# Altium footprint library ICs And Semiconductors SMD.PcbLib: 943 footprints (part 53 of 60)
Each footprint in its own frame and in the unit in brackets; x right, y up, seen from the top. Pads: shape width x height; smd on the part's side, far side on the other; paste and mask are expansions set on the pad; w line width, h text height; cw(c..) or ccw(c..) is an arc to the next point about the centre after c.
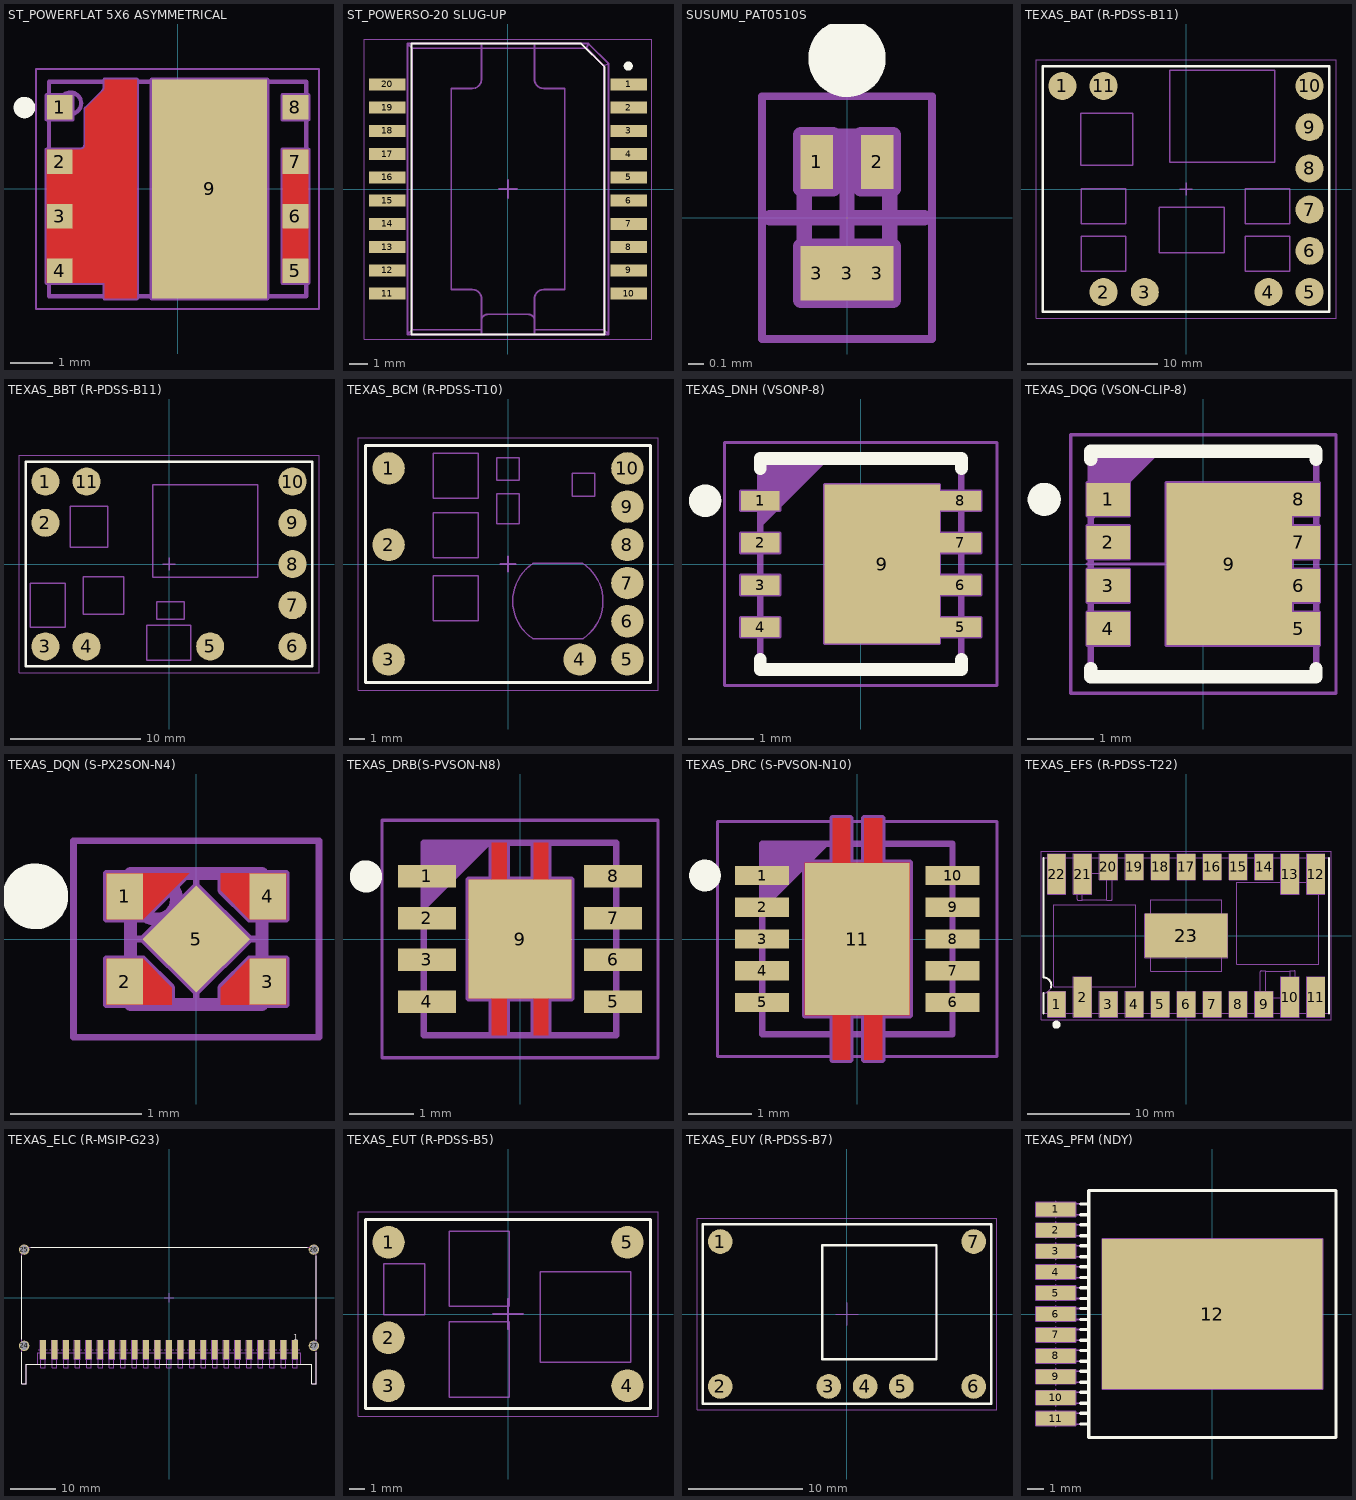
[diagram p52: the footprints below, top view; thin cyan lines are the x and y axes]

## ST_POWERFLAT 5X6 ASYMMETRICAL [mm] "PowerFLAT™ 5x6, 1.27mm Pitch; 9 Pin, Body 5.00mm W X 6.00mm L X 1.00mm H, with Two Thermal Pad (Asymmetrical Double Island)"
height 1
pads (9):
  rect 0.6x0.57 smd: 1(-2.75,1.905) 2(-2.75,0.635) 3(-2.75,-0.635) 4(-2.75,-1.905) 5(2.751,-1.905) 6(2.751,-0.635) 7(2.751,0.635) 8(2.751,1.905)
  rect 2.69x5.1 smd: 9(0.746,0)
Top Layer:
  region: 2.451,-2.19 3.051,-2.19 3.051,0.92 2.451,0.92
  region: -3.05,-2.19 -3.05,0.92 -2.25,0.92 -2.231,0.922 -2.195,0.937 -2.167,0.964 -2.152,1 -2.15,1.02 -2.15,1.87 -1.732,2.289 -1.725,2.296 -1.714,2.312 -1.707,2.33 -1.703,2.35 -1.702,2.359 -1.702,2.55 -0.949,2.55 -0.949,-2.55 -1.702,-2.55 -1.702,-2.19
Top Overlay:
  circle w0.25: c-3.575,1.9 r0.125
Mechanical 8:
  lines w0.1: -2.354,-0.354 -2,0 -2.354,0.354 ; 1.099,-0.354 0.746,0 1.099,0.354 ; -3.05,-2.19 -1.702,-2.19 -1.702,-2.55 -0.949,-2.55 -0.949,2.55 -1.702,2.55 -1.702,2.359 cw(c-1.802,2.359) -1.732,2.289 -2.15,1.87 -2.15,1.02 cw(c-2.25,1.02) -2.25,0.92 -3.05,0.92 ; -3.05,-2.19 -3.05,0.92 ; -3.05,-2.19 -3.05,-1.62 ; -3.05,-2.19 -2.45,-2.19 -2.45,-1.62 -3.05,-1.62 ; -3.05,-2.19 -2.75,-1.905 -3.05,-1.62 ; -3.05,-0.92 -3.05,-0.35 ; -3.05,-0.92 -2.45,-0.92 -2.45,-0.35 -3.05,-0.35 ; -3.05,-0.92 -2.75,-0.635 -3.05,-0.35 ; -3.05,0.35 -3.05,0.92 ; -3.05,0.35 -2.45,0.35 -2.45,0.92 -3.05,0.92 ; -3.05,0.35 -2.75,0.635 -3.05,0.92 ; -3.05,1.62 -3.05,2.19 ; -3.05,1.62 -2.45,1.62 -2.45,2.19 -3.05,2.19 ; -3.05,1.62 -2.75,1.905 -3.05,2.19 ; -1.555,-2.5 -0.985,-2.5 ; -1.555,-2.5 -1.555,-1.9 -0.985,-1.9 -0.985,-2.5 ; -1.555,-2.5 -1.27,-2.2 -0.985,-2.5 ; -1.555,2.5 -1.555,1.9 -0.985,1.9 -0.985,2.5 ; -1.555,2.5 -0.985,2.5 ; -1.555,2.5 -1.27,2.2 -0.985,2.5 ; -0.285,-2.5 0.285,-2.5 ; -0.285,-2.5 -0.285,-1.9 0.285,-1.9 0.285,-2.5 ; -0.285,-2.5 0,-2.2 0.285,-2.5 ; 0,0 0,0.5 0,0 ; 0,0 0.5,0 0,0 ; 0,0 -0.5,0 0,0 ; 0,0 0,-0.5 0,0 ; 0.985,-2.5 1.555,-2.5 ; 0.985,-2.5 0.985,-1.9 1.555,-1.9 1.555,-2.5 ; 0.985,-2.5 1.27,-2.2 1.555,-2.5 ; 0.985,2.5 0.985,1.9 1.555,1.9 1.555,2.5 ; 0.985,2.5 1.555,2.5 ; 0.985,2.5 1.27,2.2 1.555,2.5 ; 2.451,-2.19 3.051,-2.19 ; 2.451,-2.19 2.451,0.92 ; 2.451,-2.19 3.051,-2.19 ; 2.451,-2.19 2.451,-1.62 3.051,-1.62 ; 2.451,0.92 3.051,0.92 ; 2.451,0.92 2.451,0.35 3.051,0.35 ; 2.451,0.92 3.051,0.92 ; 2.451,1.62 3.051,1.62 3.051,2.19 2.451,2.19 ; 2.451,1.62 2.451,2.19 ; 2.451,1.62 2.751,1.905 2.451,2.19 ; 3.051,-2.19 3.051,0.92 ; 3.051,-2.19 3.051,-1.62 ; 3.051,-2.19 2.751,-1.905 3.051,-1.62 ; 3.051,-0.92 3.051,-0.35 ; 3.051,-0.92 2.451,-0.92 2.451,-0.35 3.051,-0.35 ; 3.051,-0.92 2.751,-0.635 3.051,-0.35 ; 3.051,0.35 3.051,0.92 ; 3.051,0.35 2.751,0.635 3.051,0.92 ; -0.599,-2.55 2.091,-2.55 2.091,2.55 -0.599,2.55 -0.599,-2.55
Mechanical 14:
  circle w0.1: c-2.5,2 r0.25
  lines w0.1: -3,-2.5 3,-2.5 3,2.5 -3,2.5 -3,-2.5
Mechanical 15:
  lines w0.05: -3.3,-2.8 3.301,-2.8 3.301,2.8 -3.3,2.8 -3.3,-2.8
3D body "ST_POWERFLAT 5X6 ASYMMETRICAL DOUBLE ISLAND.stp": height 1, standoff 0, extent -3,-2.5 3,2.5

## ST_POWERSO-20 SLUG-UP [mm] "SOIC, 1.27mm Pitch; 20 Pin, 11.00mm W X 15.70mm L X 3.50mm H body (w/Thermal Tab on Top Side"
height 3.5
pads (20):
  rect 2x0.65 smd: 1(6.6,5.715) 2(6.6,4.445) 3(6.6,3.175) 4(6.6,1.905) 5(6.6,0.635) 6(6.6,-0.635) 7(6.6,-1.905) 8(6.6,-3.175) 9(6.6,-4.445) 10(6.6,-5.715) 11(-6.6,-5.715) 12(-6.6,-4.445) 13(-6.6,-3.175) 14(-6.6,-1.905) 15(-6.6,-0.635) 16(-6.6,0.635) 17(-6.6,1.905) 18(-6.6,3.175) 19(-6.6,4.445) 20(-6.6,5.715)
Top Overlay:
  circle w0.25: c6.575,6.72 r0.125
  lines w0.1: -5.275,-7.95 -5.275,7.95 4.003,7.95 5.275,6.678 5.275,-7.95 -5.275,-7.95
Mechanical 8:
  lines w0.1: -0.5,0 0,0 ; 0,-0.5 0,0 ; 0,0.5 0,0 ; 0.5,0 0,0
Mechanical 14:
  lines w0.1: -1.45,-7.95 -1.45,-6 ccw(c-1.95,-6) -1.95,-5.5 -3.1,-5.5 -3.1,5.5 -1.95,5.5 ccw(c-1.95,6) -1.45,6 -1.45,7.95 ; -1.45,-7.696 -5.246,-7.696 ; -1.45,-7.2 cw(c-1.1,-7.2) -1.1,-6.85 1.1,-6.85 cw(c1.1,-7.2) 1.45,-7.2 ; 1.45,-7.95 1.45,-6 cw(c1.95,-6) 1.95,-5.5 3.1,-5.5 3.1,5.5 1.95,5.5 cw(c1.95,6) 1.45,6 1.45,7.95 ; 1.45,-7.696 5.246,-7.696 ; -5.5,-7.95 -5.246,-7.696 ; -5.5,-7.95 5.5,-7.95 ; -5.5,-7.95 -5.5,7.95 ; -5.5,7.95 -5.246,7.696 ; -5.5,7.95 4.4,7.95 ; -5.246,-7.696 -5.246,7.696 ; -5.246,7.696 4.295,7.696 ; 4.295,7.696 5.246,6.745 ; 4.295,7.696 4.4,7.95 ; 4.4,7.95 5.5,6.85 ; 5.246,-7.696 5.5,-7.95 ; 5.246,-7.696 5.246,6.745 ; 5.246,6.745 5.5,6.85 ; 5.5,-7.95 5.5,6.85
Mechanical 15:
  lines w0.05: -7.85,-8.2 7.85,-8.2 7.85,8.2 -7.85,8.2 -7.85,-8.2
3D body "ST_POWERSO-20 SLUG-UP.stp": height 3.5, standoff 0, extent -7.1,-7.95 7.1,7.95

## SUSUMU_PAT0510S [mm] "SUSUMU PAT0510S, 4 Pin Attenuator, Sise 0402, L 1.00 x W 0.5 H 0.39mm"
height 0.39
pads (5):
  rect 0.21x0.35 smd: 1(-0.195,0.36) 2(0.195,0.36) 3(-0.195,-0.36) 3(0.195,-0.36)
  rect 0.6x0.35 smd paste-0.175 mask-0.175: 3(0,-0.36)
Top Overlay:
  circle w0.25: c0,1.03 r0.125
Mechanical 8:
  lines w0.1: -0.5,0 0,0 ; 0,-0.5 0,0 ; 0,0.5 0,0 ; 0.5,0 0,0 ; -0.3,-0.535 -0.3,-0.185 ; -0.3,-0.535 -0.09,-0.535 -0.09,-0.185 ; -0.3,-0.535 0,-0.36 0.3,-0.535 ; -0.3,-0.535 -0.3,-0.185 ; -0.3,-0.535 0.3,-0.535 ; -0.3,-0.185 -0.195,-0.36 -0.09,-0.185 ; -0.3,-0.185 -0.09,-0.185 ; -0.3,-0.185 0.3,-0.185 ; -0.3,0.535 -0.195,0.36 -0.09,0.535 ; -0.3,0.535 -0.3,0.185 -0.09,0.185 -0.09,0.535 ; -0.3,0.535 -0.09,0.535 ; 0.09,-0.185 0.195,-0.36 0.3,-0.185 ; 0.09,-0.185 0.09,-0.535 0.3,-0.535 ; 0.09,-0.185 0.3,-0.185 ; 0.09,0.535 0.195,0.36 0.3,0.535 ; 0.09,0.535 0.09,0.185 0.3,0.185 0.3,0.535 ; 0.09,0.535 0.3,0.535 ; 0.3,-0.535 0.3,-0.185 ; 0.3,-0.535 0.3,-0.185
Mechanical 14:
  circle w0.1: c0,0.325 r0.075
  lines w0.1: -0.275,-0.525 -0.275,0.525 0.275,0.525 0.275,-0.525 -0.275,-0.525
Mechanical 15:
  lines w0.05: -0.55,-0.785 -0.55,0.785 0.55,0.785 0.55,-0.785 -0.55,-0.785
3D body "SUSUMU_PAT0510S.stp": height 0.39, standoff 0, extent -0.275,-0.525 0.275,0.525

## TEXAS_BAT (R-PDSS-B11) [mm] "TEXAS BAT (R-PDSS-B11) Case"
height 8.5
pads (11):
  round 2.16 smd: 1(-9.525,7.938) 2(-6.35,-7.938) 3(-3.175,-7.938) 4(6.35,-7.938) 5(9.525,-7.938) 6(9.525,-4.763) 7(9.525,-1.587) 8(9.525,1.587) 9(9.525,4.763) 10(9.525,7.938) 11(-6.35,7.938)
Top Overlay:
  lines w0.2: -11.049,-9.462 11.049,-9.462 11.049,9.462 -11.049,9.462 -11.049,-9.462
Mechanical 8:
  lines w0.1: -10.025,7.938 -9.525,7.938 ; -9.525,7.438 -9.525,7.938 ; -9.525,8.438 -9.525,7.938 ; -9.025,7.938 -9.525,7.938 ; -6.85,-7.938 -6.35,-7.938 ; -6.85,7.938 -6.35,7.938 ; -6.35,-8.438 -6.35,-7.938 ; -6.35,-7.438 -6.35,-7.938 ; -6.35,7.438 -6.35,7.938 ; -6.35,8.438 -6.35,7.938 ; -5.85,-7.938 -6.35,-7.938 ; -5.85,7.938 -6.35,7.938 ; -3.675,-7.938 -3.175,-7.938 ; -3.175,-8.438 -3.175,-7.938 ; -3.175,-7.438 -3.175,-7.938 ; -2.675,-7.938 -3.175,-7.938 ; -0.5,0 0,0 ; 0,-0.5 0,0 ; 0,0.5 0,0 ; 0.5,0 0,0 ; 5.85,-7.938 6.35,-7.938 ; 6.35,-8.438 6.35,-7.938 ; 6.35,-7.438 6.35,-7.938 ; 6.85,-7.938 6.35,-7.938 ; 9.025,-7.938 9.525,-7.938 ; 9.025,-4.763 9.525,-4.763 ; 9.025,-1.587 9.525,-1.587 ; 9.025,1.587 9.525,1.587 ; 9.025,4.763 9.525,4.763 ; 9.025,7.938 9.525,7.938 ; 9.525,-8.438 9.525,-7.938 ; 9.525,-7.438 9.525,-7.938 ; 9.525,-5.263 9.525,-4.763 ; 9.525,-4.263 9.525,-4.763 ; 9.525,-2.088 9.525,-1.587 ; 9.525,-1.088 9.525,-1.587 ; 9.525,1.088 9.525,1.587 ; 9.525,2.088 9.525,1.587 ; 9.525,4.263 9.525,4.763 ; 9.525,5.263 9.525,4.763 ; 9.525,7.438 9.525,7.938 ; 9.525,8.438 9.525,7.938 ; 10.025,-7.938 9.525,-7.938 ; 10.025,-4.763 9.525,-4.763 ; 10.025,-1.587 9.525,-1.587 ; 10.025,1.587 9.525,1.587 ; 10.025,4.763 9.525,4.763 ; 10.025,7.938 9.525,7.938
Mechanical 14:
  lines w0.1: -11.049,-9.462 -11.049,9.462 11.049,9.462 11.049,-9.462 -11.049,-9.462 ; -8.122,1.829 -8.122,5.829 -4.122,5.829 -4.122,1.829 -8.122,1.829 ; -8.054,-6.337 -8.054,-3.637 -4.654,-3.637 -4.654,-6.337 -8.054,-6.337 ; -8.054,-2.671 -8.054,0.029 -4.654,0.029 -4.654,-2.671 -8.054,-2.671 ; -2.059,-4.897 2.941,-4.897 2.941,-1.397 -2.059,-1.397 -2.059,-4.897 ; -1.251,2.062 -1.251,9.162 6.849,9.162 6.849,2.062 -1.251,2.062 ; 4.584,-6.337 4.584,-3.637 7.984,-3.637 7.984,-6.337 4.584,-6.337 ; 4.584,-2.671 4.584,0.029 7.984,0.029 7.984,-2.671 4.584,-2.671
Mechanical 15:
  lines w0.05: -11.557,-9.97 -11.557,9.97 11.557,9.97 11.557,-9.97 -11.557,-9.97
3D body "TEXAS_BAT (R-PDSS-B11).stp": height 9.09, standoff 0, extent -11.049,-9.461 11.049,9.462

## TEXAS_BBT (R-PDSS-B11) [mm] "TEXAS BBT (R-PDSS-B11) Case"
height 8.5
pads (11):
  round 2.16 smd: 1(-9.525,6.35) 2(-9.525,3.175) 3(-9.525,-6.35) 4(-6.35,-6.35) 5(3.175,-6.35) 6(9.525,-6.35) 7(9.525,-3.175) 8(9.525,0) 9(9.525,3.175) 10(9.525,6.35) 11(-6.35,6.35)
Top Overlay:
  lines w0.2: -11.049,-7.874 -11.049,7.874 11.049,7.874 11.049,-7.874 -11.049,-7.874
Mechanical 8:
  lines w0.1: -10.025,-6.35 -9.525,-6.35 ; -10.025,3.175 -9.525,3.175 ; -10.025,6.35 -9.525,6.35 ; -9.525,-6.85 -9.525,-6.35 ; -9.525,-5.85 -9.525,-6.35 ; -9.525,2.675 -9.525,3.175 ; -9.525,3.675 -9.525,3.175 ; -9.525,5.85 -9.525,6.35 ; -9.525,6.85 -9.525,6.35 ; -9.025,-6.35 -9.525,-6.35 ; -9.025,3.175 -9.525,3.175 ; -9.025,6.35 -9.525,6.35 ; -6.85,-6.35 -6.35,-6.35 ; -6.85,6.35 -6.35,6.35 ; -6.35,-6.85 -6.35,-6.35 ; -6.35,-5.85 -6.35,-6.35 ; -6.35,5.85 -6.35,6.35 ; -6.35,6.85 -6.35,6.35 ; -5.85,-6.35 -6.35,-6.35 ; -5.85,6.35 -6.35,6.35 ; -0.5,0 0,0 ; 0,-0.5 0,0 ; 0,0.5 0,0 ; 0.5,0 0,0 ; 2.675,-6.35 3.175,-6.35 ; 3.175,-6.85 3.175,-6.35 ; 3.175,-5.85 3.175,-6.35 ; 3.675,-6.35 3.175,-6.35 ; 9.025,-3.175 9.525,-3.175 ; 9.025,0 9.525,0 ; 9.025,3.175 9.525,3.175 ; 9.025,6.35 9.525,6.35 ; 9.525,-3.675 9.525,-3.175 ; 9.525,-2.675 9.525,-3.175 ; 9.525,-0.5 9.525,0 ; 9.525,0.5 9.525,0 ; 9.525,2.675 9.525,3.175 ; 9.525,3.675 9.525,3.175 ; 9.525,5.85 9.525,6.35 ; 9.525,6.85 9.525,6.35 ; 10.025,-3.175 9.525,-3.175 ; 10.025,0 9.525,0 ; 10.025,3.175 9.525,3.175 ; 10.025,6.35 9.525,6.35 ; 9.525,-6.35 9.525,-5.85 9.525,-6.35 ; 9.525,-6.35 10.025,-6.35 9.525,-6.35 ; 9.525,-6.35 9.525,-6.85 9.525,-6.35 ; 9.525,-6.35 9.025,-6.35 9.525,-6.35
Mechanical 14:
  lines w0.1: -11.049,-7.874 11.049,-7.874 11.049,7.874 -11.049,7.874 -11.049,-7.874 ; -10.681,-4.876 -7.981,-4.876 -7.981,-1.476 -10.681,-1.476 -10.681,-4.876 ; -7.601,1.286 -4.701,1.286 -4.701,4.436 -7.601,4.436 -7.601,1.286 ; -6.625,-3.872 -3.475,-3.872 -3.475,-0.972 -6.625,-0.972 -6.625,-3.872 ; -1.721,-7.416 1.679,-7.416 1.679,-4.716 -1.721,-4.716 -1.721,-7.416 ; -1.251,-1.005 6.849,-1.005 6.849,6.095 -1.251,6.095 -1.251,-1.005 ; -0.929,-4.272 1.171,-4.272 1.171,-2.922 -0.929,-2.922 -0.929,-4.272
Mechanical 15:
  lines w0.05: -11.557,-8.382 11.557,-8.382 11.557,8.382 -11.557,8.382 -11.557,-8.382
3D body "TEXAS_BBT (R-PDSS-B11).stp": height 9.09, standoff 0, extent -11.049,-7.874 11.049,7.874

## TEXAS_BCM (R-PDSS-T10) [mm] "TEXAS BCM (R-PDSS-T10)  Case"
height 8.5
pads (10):
  round 2.16 smd: 1(-7.935,6.355) 2(-7.935,1.275) 3(-7.935,-6.345) 4(4.765,-6.345) 5(7.935,-6.345) 6(7.935,-3.805) 7(7.935,-1.265) 8(7.935,1.275) 9(7.935,3.815) 10(7.935,6.355)
Top Overlay:
  lines w0.2: -9.46,-7.875 -9.46,7.875 9.46,7.875 9.46,-7.875 -9.46,-7.875
Mechanical 8:
  lines w0.1: -8.435,-6.345 -7.935,-6.345 ; -8.435,1.275 -7.935,1.275 ; -8.435,6.355 -7.935,6.355 ; -7.935,-6.845 -7.935,-6.345 ; -7.935,-5.845 -7.935,-6.345 ; -7.935,0.775 -7.935,1.275 ; -7.935,1.775 -7.935,1.275 ; -7.935,5.855 -7.935,6.355 ; -7.935,6.855 -7.935,6.355 ; -7.435,-6.345 -7.935,-6.345 ; -7.435,1.275 -7.935,1.275 ; -7.435,6.355 -7.935,6.355 ; -0.5,0 0,0 ; 0,-0.5 0,0 ; 0,0.5 0,0 ; 0.5,0 0,0 ; 4.265,-6.345 4.765,-6.345 ; 4.765,-6.845 4.765,-6.345 ; 4.765,-5.845 4.765,-6.345 ; 5.265,-6.345 4.765,-6.345 ; 7.435,-6.345 7.935,-6.345 ; 7.435,-3.805 7.935,-3.805 ; 7.435,-1.265 7.935,-1.265 ; 7.435,1.275 7.935,1.275 ; 7.435,3.815 7.935,3.815 ; 7.435,6.355 7.935,6.355 ; 7.935,-6.845 7.935,-6.345 ; 7.935,-5.845 7.935,-6.345 ; 7.935,-4.305 7.935,-3.805 ; 7.935,-3.305 7.935,-3.805 ; 7.935,-1.765 7.935,-1.265 ; 7.935,-0.765 7.935,-1.265 ; 7.935,0.775 7.935,1.275 ; 7.935,1.775 7.935,1.275 ; 7.935,3.315 7.935,3.815 ; 7.935,4.315 7.935,3.815 ; 7.935,5.855 7.935,6.355 ; 7.935,6.855 7.935,6.355 ; 8.435,-6.345 7.935,-6.345 ; 8.435,-3.805 7.935,-3.805 ; 8.435,-1.265 7.935,-1.265 ; 8.435,1.275 7.935,1.275 ; 8.435,3.815 7.935,3.815 ; 8.435,6.355 7.935,6.355
Mechanical 14:
  lines w0.1: -9.46,-7.875 9.46,-7.875 9.46,7.875 -9.46,7.875 -9.46,-7.875 ; -4.963,-3.774 -1.963,-3.774 -1.963,-0.774 -4.963,-0.774 -4.963,-3.774 ; -4.963,0.422 -1.963,0.422 -1.963,3.422 -4.963,3.422 -4.963,0.422 ; -4.963,4.361 -1.963,4.361 -1.963,7.361 -4.963,7.361 -4.963,4.361 ; -0.75,2.683 0.75,2.683 0.75,4.683 -0.75,4.683 -0.75,2.683 ; -0.75,5.572 0.75,5.572 0.75,7.072 -0.75,7.072 -0.75,5.572 ; 1.656,-4.966 cw(c3.314,-2.466) 1.656,0.034 4.972,0.034 cw(c3.314,-2.466) 4.972,-4.966 1.656,-4.966 ; 4.255,4.516 5.755,4.516 5.755,6.016 4.255,6.016 4.255,4.516
Mechanical 15:
  lines w0.05: -9.97,-8.38 -9.97,8.38 9.97,8.38 9.97,-8.38 -9.97,-8.38
3D body "TEXAS_BCM (R-PDSS-T10).stp": height 8.5, standoff 0, extent -9.46,-7.875 9.46,7.875

## TEXAS_DNH (VSONP-8) [mm] "TEXAS Case Style DNH, VSON, 0.65mm pitch, 8 pin, 3mm X 3.15mm X 0.9mm H body (w/thermal tab 1.84 X 2.45mm)"
height 0.9
pads (9):
  rect 0.6x0.3 smd: 1(-1.55,0.975) 2(-1.55,0.325) 3(-1.55,-0.325) 4(-1.55,-0.975)
  rect 0.64x0.3 smd: 5(1.532,-0.975) 6(1.532,-0.325) 7(1.532,0.325) 8(1.532,0.975)
  rect 1.78x2.45 smd: 9(0.327,0)
Top Overlay:
  circle w0.25: c-2.4,0.975 r0.125
  lines w0.2: -1.55,-1.475 -1.55,-1.625 1.55,-1.625 1.55,-1.475 ; -1.55,1.475 -1.55,1.625 1.55,1.625 1.55,1.475
Mechanical 8:
  lines w0.05: -0.5,0 0,0 ; 0,-0.5 0,0 ; 0,0.5 0,0 ; 0.327,-0.5 0.327,0 ; 0.327,0.5 0.327,0 ; 0.827,0 0.327,0 ; 1.215,-1.125 1.85,-1.125 ; 1.215,-0.825 1.85,-0.825 ; 1.215,-0.475 1.85,-0.475 ; 1.215,-0.175 1.85,-0.175 ; 1.215,0.175 1.85,0.175 ; 1.215,0.475 1.85,0.475 ; 1.215,0.825 1.85,0.825 ; 1.215,1.125 1.85,1.125 ; -1.85,-1.125 -1.55,-0.975 -1.85,-0.825 ; -1.85,-1.125 -1.85,-0.825 ; -1.85,-1.125 -1.25,-1.125 -1.25,-0.825 -1.85,-0.825 ; -1.85,-0.475 -1.55,-0.325 -1.85,-0.175 ; -1.85,-0.475 -1.85,-0.175 ; -1.85,-0.475 -1.25,-0.475 -1.25,-0.175 -1.85,-0.175 ; -1.85,0.175 -1.55,0.325 -1.85,0.475 ; -1.85,0.175 -1.85,0.475 ; -1.85,0.175 -1.25,0.175 -1.25,0.475 -1.85,0.475 ; -1.85,0.825 -1.55,0.975 -1.85,1.125 ; -1.85,0.825 -1.85,1.125 ; -1.85,0.825 -1.25,0.825 -1.25,1.125 -1.85,1.125 ; 0,0 0.327,0 ; 1.85,-1.125 1.532,-0.975 1.85,-0.825 ; 1.85,-1.125 1.85,-0.825 ; 1.85,-0.475 1.532,-0.325 1.85,-0.175 ; 1.85,-0.475 1.85,-0.175 ; 1.85,0.175 1.532,0.325 1.85,0.475 ; 1.85,0.175 1.85,0.475 ; 1.85,0.825 1.532,0.975 1.85,1.125 ; 1.85,0.825 1.85,1.125 ; -0.56,-1.225 1.215,-1.225 1.215,1.225 -0.56,1.225 -0.56,-1.225
Mechanical 14:
  lines w0.1: -1.55,0.625 -0.55,1.625 ; -1.55,0.725 -0.65,1.625 ; -1.55,0.825 -0.75,1.625 ; -1.55,0.925 -0.85,1.625 ; -1.55,1.025 -0.95,1.625 ; -1.55,1.125 -1.05,1.625 ; -1.55,1.225 -1.15,1.625 ; -1.55,1.325 -1.25,1.625 ; -1.55,1.425 -1.35,1.625 ; -1.55,1.525 -1.45,1.625 ; -1.55,-1.625 1.55,-1.625 1.55,1.625 -1.55,1.625 -1.55,-1.625
Mechanical 15:
  lines w0.05: -2.1,-1.875 -2.1,1.875 2.1,1.875 2.1,-1.875 -2.1,-1.875
3D body "TEXAS_DNH (VSONP-8).stp": height 0.9, standoff 0, extent -1.65,-1.625 1.595,1.625

## TEXAS_DQG (VSON-CLIP-8) [mm] "TEXAS Case Style DQG, VSON, 0.65mm pitch, 8 pin, 3.3mm X 3.3mm X 1.10mm H body (w/thermal tab 1.90 X 2.45mm)"
height 1.1
pads (9):
  rect 0.65x0.5 smd: 1(-1.435,0.975) 2(-1.435,0.325) 3(-1.435,-0.325) 4(-1.435,-0.975) 5(1.435,-0.975) 6(1.435,-0.325) 7(1.435,0.325) 8(1.435,0.975)
  rect 1.9x2.45 smd: 9(0.39,0)
Top Overlay:
  circle w0.25: c-2.4,0.975 r0.125
  lines w0.2: -1.7,-1.575 -1.7,-1.7 1.7,-1.7 1.7,-1.575 ; -1.7,1.575 -1.7,1.7 1.7,1.7 1.7,1.575
Mechanical 8:
  lines w0.05: -1.75,0 0,0 ; -0.5,0 0,0 ; 0,-0.5 0,0 ; 0,0.5 0,0 ; 0.39,-0.5 0.39,0 ; 0.39,0.5 0.39,0 ; 0.89,0 0.39,0 ; -1.75,-1.225 -1.435,-0.975 -1.75,-0.725 ; -1.75,-1.225 -1.75,-0.725 ; -1.75,-1.225 -1.12,-1.225 -1.12,-0.725 -1.75,-0.725 ; -1.75,-0.575 -1.435,-0.325 -1.75,-0.075 ; -1.75,-0.575 -1.75,-0.075 ; -1.75,-0.575 -1.12,-0.575 -1.12,-0.075 -1.75,-0.075 ; -1.75,0.075 -1.435,0.325 -1.75,0.575 ; -1.75,0.075 -1.75,0.575 ; -1.75,0.075 -1.12,0.075 -1.12,0.575 -1.75,0.575 ; -1.75,0.725 -1.435,0.975 -1.75,1.225 ; -1.75,0.725 -1.75,1.225 ; -1.75,0.725 -1.12,0.725 -1.12,1.225 -1.75,1.225 ; 0,0 0.39,0 ; 1.34,-1.225 -0.56,-1.225 -0.56,1.225 1.34,1.225 1.34,-1.225 ; 1.34,-1.225 1.75,-1.225 ; 1.75,-1.225 1.435,-0.975 1.75,-0.725 ; 1.75,-1.225 1.75,-0.725 ; 1.75,-1.225 1.12,-1.225 1.12,-0.725 1.75,-0.725 ; 1.75,-0.575 1.435,-0.325 1.75,-0.075 ; 1.75,-0.575 1.75,-0.075 ; 1.75,-0.575 1.12,-0.575 1.12,-0.075 1.75,-0.075 ; 1.75,0.075 1.435,0.325 1.75,0.575 ; 1.75,0.075 1.75,0.575 ; 1.75,0.075 1.12,0.075 1.12,0.575 1.75,0.575 ; 1.75,0.725 1.435,0.975 1.75,1.225 ; 1.75,0.725 1.75,1.225 ; 1.75,0.725 1.12,0.725 1.12,1.225 1.75,1.225
Mechanical 14:
  lines w0.1: -1.7,0.7 -0.7,1.7 ; -1.7,0.8 -0.8,1.7 ; -1.7,0.9 -0.9,1.7 ; -1.7,1 -1,1.7 ; -1.7,1.1 -1.1,1.7 ; -1.7,1.2 -1.2,1.7 ; -1.7,1.3 -1.3,1.7 ; -1.7,1.4 -1.4,1.7 ; -1.7,1.5 -1.5,1.7 ; -1.7,1.6 -1.6,1.7 ; -1.7,-1.7 -1.7,1.7 1.7,1.7 1.7,-1.7 -1.7,-1.7
Mechanical 15:
  lines w0.05: -2,-1.95 2,-1.95 2,1.95 -2,1.95 -2,-1.95
3D body "TEXAS_DQG (VSON-CLIP-8).stp": height 1.1, standoff 0, extent -1.7,-1.7 1.7,1.7

## TEXAS_DQN (S-PX2SON-N4) [mm] "TEXAS Case Style DQN (S-PX2SON-N4), SON, 0.65mm Pitch, Square; 4 Pin, 1.00mm L X 1.00mm W X 0.4mm H body (w/thermal tab 0.5 X 0.5mm)"
height 0.4
pads (5):
  rect 0.28x0.35 smd: 1(-0.545,0.325) 2(-0.545,-0.325) 3(0.545,-0.325) 4(0.545,0.325)
  rect 0.58x0.58 smd rot 45: 5(0,0)
Top Layer:
  region: -0.685,-0.5 -0.685,-0.15 -0.405,-0.15 -0.185,-0.37 -0.185,-0.5
  region: 0.185,-0.5 0.685,-0.5 0.685,-0.15 0.405,-0.15 0.185,-0.37
  region: 0.405,0.15 0.185,0.37 0.185,0.5 0.685,0.5 0.685,0.15
  region: -0.685,0.15 -0.405,0.15 -0.055,0.5 -0.685,0.5
Top Overlay:
  circle w0.25: c-1.225,0.325 r0.125
Mechanical 8:
  lines w0.05: -0.5,0 0,0 ; 0,-0.5 0,0 ; 0,0.5 0,0 ; 0.5,0 0,0 ; -0.685,-0.5 -0.185,-0.5 -0.185,-0.37 -0.405,-0.15 -0.685,-0.15 ; -0.685,-0.5 -0.685,-0.15 ; -0.685,-0.5 -0.435,-0.325 -0.685,-0.15 ; -0.685,-0.5 -0.545,-0.325 -0.685,-0.15 ; -0.685,0.15 -0.405,0.15 -0.055,0.5 -0.685,0.5 ; -0.685,0.15 -0.685,0.5 ; -0.685,0.15 -0.37,0.325 -0.685,0.5 ; -0.685,0.15 -0.545,0.325 -0.685,0.5 ; 0.685,-0.5 0.685,-0.15 ; 0.685,-0.5 0.185,-0.5 0.185,-0.37 0.405,-0.15 0.685,-0.15 ; 0.685,-0.5 0.435,-0.325 0.685,-0.15 ; 0.685,-0.5 0.545,-0.325 0.685,-0.15 ; 0.685,0.15 0.685,0.5 ; 0.685,0.15 0.405,0.15 0.185,0.37 0.185,0.5 0.685,0.5 ; 0.685,0.15 0.435,0.325 0.685,0.5 ; 0.685,0.15 0.545,0.325 0.685,0.5 ; -0.41,0 0,-0.41 0.41,0 0,0.41 -0.41,0
Mechanical 14:
  circle w0.1: c-0.3,0.3 r0.15
  lines w0.1: -0.5,-0.5 -0.5,0.5 0.5,0.5 0.5,-0.5 -0.5,-0.5 ; -0.5,-0.45 -0.275,-0.45 -0.275,-0.425 -0.465,-0.235 -0.5,-0.235 -0.5,-0.45
Mechanical 15:
  lines w0.05: -0.935,-0.75 -0.935,0.75 0.935,0.75 0.935,-0.75 -0.935,-0.75
3D body "TEXAS_DQN (S-PX2SON-N4).stp": height 0.4, standoff 0, extent -0.5,-0.5 0.5,0.5

## TEXAS_DRB(S-PVSON-N8) [mm] "TEXAS Case Style DRB(S-PVSON-N8), SON, 0.65mm pitch, 8 pin, 3mm X 3mm X 1.00mm H body (w/thermal tab 1.60 X 1.85mm)"
height 1
pads (9):
  rect 0.9x0.35 smd: 1(-1.45,0.975) 2(-1.45,0.325) 3(-1.45,-0.325) 4(-1.45,-0.975) 5(1.45,-0.975) 6(1.45,-0.325) 7(1.45,0.325) 8(1.45,0.975)
  rect 1.6x1.85 smd: 9(0,0)
Top Layer:
  region: -0.44,-1.5 -0.44,-0.925 -0.8,-0.925 -0.8,0.925 -0.44,0.925 -0.44,1.5 -0.21,1.5 -0.21,0.925 0.21,0.925 0.21,1.5 0.44,1.5 0.44,0.925 0.8,0.925 0.8,-0.925 0.44,-0.925 0.44,-1.5 0.21,-1.5 0.21,-0.925 -0.21,-0.925 -0.21,-1.5
Top Overlay:
  circle w0.25: c-2.4,0.975 r0.125
Mechanical 8:
  lines w0.1: -0.8,-0.925 -0.44,-0.925 -0.44,-1.5 -0.21,-1.5 -0.21,-0.925 0.21,-0.925 0.21,-1.5 0.44,-1.5 0.44,-0.925 0.8,-0.925 0.8,0.925 0.44,0.925 0.44,1.5 0.21,1.5 0.21,0.925 -0.21,0.925 -0.21,1.5 -0.44,1.5 -0.44,0.925 -0.8,0.925 -0.8,-0.925
Mechanical 14:
  lines w0.1: -1.5,0.5 -0.5,1.5 ; -1.5,0.6 -0.6,1.5 ; -1.5,0.7 -0.7,1.5 ; -1.5,0.8 -0.8,1.5 ; -1.5,0.9 -0.9,1.5 ; -1.5,1 -1,1.5 ; -1.5,1.1 -1.1,1.5 ; -1.5,1.2 -1.2,1.5 ; -1.5,1.3 -1.3,1.5 ; -1.5,1.4 -1.4,1.5 ; -1.5,-1.5 1.5,-1.5 1.5,1.5 -1.5,1.5 -1.5,-1.5
Mechanical 15:
  circle w0.05: c0,0 r0.35
  lines w0.05: -0.5,0 0.5,0 ; 0,-0.5 0,0.5 ; -2.15,-1.85 -2.15,1.85 2.15,1.85 2.15,-1.85 -2.15,-1.85
3D body "TEXAS_DRB(S-PVSON-N8).stp": height 1, standoff 0, extent -1.5,-1.5 1.5,1.5

## TEXAS_DRC (S-PVSON-N10) [mm] "SON, TEXAS DRC (S-PVSON-N10), 0.50mm Pitch, 10-pin, 3.00mm W  X 3.00mm L X 1.00mm Height, (w/thermal tab 1.65 X 2.40 mm)"
height 1
pads (11):
  rect 0.85x0.3 smd: 1(-1.5,1) 2(-1.5,0.5) 3(-1.5,0) 4(-1.5,-0.5) 5(-1.5,-1) 6(1.5,-1) 7(1.5,-0.5) 8(1.5,0) 9(1.5,0.5) 10(1.5,1)
  rect 1.65x2.4 smd: 11(0,0)
Top Layer:
  region: -0.825,1.2 -0.39,1.2 -0.39,1.9 -0.11,1.9 -0.11,1.2 0.11,1.2 0.11,1.9 0.39,1.9 0.39,1.2 0.825,1.2 0.825,-1.2 0.39,-1.2 0.39,-1.9 0.11,-1.9 0.11,-1.2 -0.11,-1.2 -0.11,-1.9 -0.39,-1.9 -0.39,-1.2 -0.825,-1.2
Top Overlay:
  circle w0.25: c-2.4,1 r0.125
Mechanical 8:
  lines w0.1: -0.5,0 0,0 ; 0,-0.5 0,0 ; 0,0.5 0,0 ; 0.5,0 0,0 ; -0.825,-1.2 -0.825,1.2 -0.39,1.2 -0.39,1.9 -0.11,1.9 -0.11,1.2 0.11,1.2 0.11,1.9 0.39,1.9 0.39,1.2 0.825,1.2 0.825,-1.2 0.39,-1.2 0.39,-1.9 0.11,-1.9 0.11,-1.2 -0.11,-1.2 -0.11,-1.9 -0.39,-1.9 -0.39,-1.2 -0.825,-1.2
Mechanical 14:
  lines w0.1: -1.5,0.5 -0.5,1.5 ; -1.5,0.6 -0.6,1.5 ; -1.5,0.7 -0.7,1.5 ; -1.5,0.8 -0.8,1.5 ; -1.5,0.9 -0.9,1.5 ; -1.5,1 -1,1.5 ; -1.5,1.1 -1.1,1.5 ; -1.5,1.2 -1.2,1.5 ; -1.5,1.3 -1.3,1.5 ; -1.5,1.4 -1.4,1.5 ; -1.5,-1.5 1.5,-1.5 1.5,1.5 -1.5,1.5 -1.5,-1.5
Mechanical 15:
  lines w0.05: -0.5,0 0.5,0 ; 0,-0.5 0,0.5 ; -2.2,-1.85 -2.2,1.85 2.2,1.85 2.2,-1.85 -2.2,-1.85
3D body "TEXAS_DRC (S-PVSON-N10).stp": height 1, standoff 0, extent -1.575,-1.575 1.575,1.575

## TEXAS_EFS (R-PDSS-T22) [mm] "TEXAS EFS (R-PDSS-T22) Case"
height 6
pads (23):
  rect 1.78x2.54 smd: 1(-12.7,-6.73) 3(-7.62,-6.73) 4(-5.08,-6.73) 5(-2.54,-6.73) 6(0,-6.73) 7(2.54,-6.73) 8(5.08,-6.73) 9(7.62,-6.73) 14(7.62,6.73) 15(5.08,6.73) 16(2.54,6.73) 17(0,6.73) 18(-2.54,6.73) 19(-5.08,6.73) 20(-7.62,6.73)
  rect 1.78x3.94 smd: 2(-10.16,-6.03) 10(10.16,-6.03) 11(12.7,-6.03) 12(12.7,6.03) 13(10.16,6.03) 21(-10.16,6.03) 22(-12.7,6.03)
  rect 8.1x4.3 smd: 23(0,0)
Top Overlay:
  circle w0.4: c-12.725,-8.725 r0.2
  lines w0.2: -13.97,-7.62 -13.97,-5.62 ; -13.97,7.62 -13.97,-4.12 cw(c-13.97,-4.87) -13.259,-5.11 ; 13.97,-7.62 13.97,7.62
Top Paste:
  region: 3.53,-1.14 3.53,1.14 1.51,1.14 1.51,-1.14
  region: 1.01,-1.14 1.01,1.14 -1.01,1.14 -1.01,-1.14
  region: -1.51,-1.14 -1.51,1.14 -3.53,1.14 -3.53,-1.14
Mechanical 8:
  drawing of 184 lines, arcs and shapes, not listed
Mechanical 14:
  drawing of 156 lines, arcs and shapes, not listed
Mechanical 15:
  lines w0.05: -14.22,-8.25 -14.22,8.25 14.22,8.25 14.22,-8.25 -14.22,-8.25
3D body "TEXAS_EFS (R-PDSS-T22).stp": height 6, standoff 0, extent -13.97,-7.62 13.97,7.62

## TEXAS_ELC (R-MSIP-G23) [mm] "TEXAS ELC (R-MSIP-G23) Case"
height 12.7
pads (27):
  rect 1.27x4.19 smd: 1(27.941,-11.509) 2(25.401,-11.509) 3(22.861,-11.509) 4(20.321,-11.509) 5(17.781,-11.509) 6(15.241,-11.509) 7(12.701,-11.509) 8(10.161,-11.509) 9(7.621,-11.509) 10(5.081,-11.509) 11(2.541,-11.509) 12(0.001,-11.509) 13(-2.539,-11.509) 14(-5.079,-11.509) 15(-7.619,-11.509) 16(-10.159,-11.509) 17(-12.699,-11.509) 18(-15.239,-11.509) 19(-17.779,-11.509) 20(-20.319,-11.509) 21(-22.859,-11.509) 22(-25.399,-11.509) 23(-27.939,-11.509)
  round 2.3 hole 1.8: 24(-32.105,-10.665) 25(-32.105,10.665) 26(32.105,10.665) 27(32.105,-10.665)
Top Overlay:
  lines w0.2: -32.605,-12.079 -32.605,-19.055 -31.605,-19.055 -31.605,-14.735 31.605,-14.735 31.605,-19.055 32.605,-19.055 32.605,-12.079 ; -32.605,-9.251 -32.605,9.251 ; -30.691,11.165 30.691,11.165 ; 32.605,-9.251 32.605,9.251
  text "1" at 27.559,-9.398 h1.27
Mechanical 8:
  drawing of 204 lines, arcs and shapes, not listed
Mechanical 14:
  lines w0.1: -29.105,-14.735 -29.105,-12.235 29.105,-12.235 29.105,-14.735 ; -28.44,-14.735 -31.605,-14.735 -31.605,-19.055 -32.605,-19.055 -32.605,11.165 32.605,11.165 32.605,-19.055 31.605,-19.055 31.605,-14.735 28.44,-14.735 ; -27.44,-14.735 -25.9,-14.735 ; -24.9,-14.735 -23.36,-14.735 ; -22.36,-14.735 -20.82,-14.735 ; -19.82,-14.735 -18.28,-14.735 ; -17.28,-14.735 -15.74,-14.735 ; -14.74,-14.735 -13.2,-14.735 ; -12.2,-14.735 -10.66,-14.735 ; -9.66,-14.735 -8.12,-14.735 ; -7.12,-14.735 -5.58,-14.735 ; -4.58,-14.735 -3.04,-14.735 ; -2.04,-14.735 -0.5,-14.735 ; 0.5,-14.735 2.04,-14.735 ; 3.04,-14.735 4.58,-14.735 ; 5.58,-14.735 7.12,-14.735 ; 8.12,-14.735 9.66,-14.735 ; 10.66,-14.735 12.2,-14.735 ; 13.2,-14.735 14.74,-14.735 ; 15.74,-14.735 17.28,-14.735 ; 18.28,-14.735 19.82,-14.735 ; 20.82,-14.735 22.36,-14.735 ; 23.36,-14.735 24.9,-14.735 ; 25.9,-14.735 27.44,-14.735 ; -28.44,-15.535 -28.44,-13.331 -27.44,-13.331 -27.44,-15.535 -28.44,-15.535 ; -25.9,-15.535 -25.9,-13.331 -24.9,-13.331 -24.9,-15.535 -25.9,-15.535 ; -23.36,-15.535 -23.36,-13.331 -22.36,-13.331 -22.36,-15.535 -23.36,-15.535 ; -20.82,-15.535 -20.82,-13.331 -19.82,-13.331 -19.82,-15.535 -20.82,-15.535 ; -18.28,-15.535 -18.28,-13.331 -17.28,-13.331 -17.28,-15.535 -18.28,-15.535 ; -15.74,-15.535 -15.74,-13.331 -14.74,-13.331 -14.74,-15.535 -15.74,-15.535 ; -13.2,-15.535 -13.2,-13.331 -12.2,-13.331 -12.2,-15.535 -13.2,-15.535 ; -10.66,-15.535 -10.66,-13.331 -9.66,-13.331 -9.66,-15.535 -10.66,-15.535 ; -8.12,-15.535 -8.12,-13.331 -7.12,-13.331 -7.12,-15.535 -8.12,-15.535 ; -5.58,-15.535 -5.58,-13.331 -4.58,-13.331 -4.58,-15.535 -5.58,-15.535 ; -3.04,-15.535 -3.04,-13.331 -2.04,-13.331 -2.04,-15.535 -3.04,-15.535 ; -0.5,-15.535 -0.5,-13.331 0.5,-13.331 0.5,-15.535 -0.5,-15.535 ; 2.04,-15.535 2.04,-13.331 3.04,-13.331 3.04,-15.535 2.04,-15.535 ; 4.58,-15.535 4.58,-13.331 5.58,-13.331 5.58,-15.535 4.58,-15.535 ; 7.12,-15.535 7.12,-13.331 8.12,-13.331 8.12,-15.535 7.12,-15.535 ; 9.66,-15.535 9.66,-13.331 10.66,-13.331 10.66,-15.535 9.66,-15.535 ; 12.2,-15.535 12.2,-13.331 13.2,-13.331 13.2,-15.535 12.2,-15.535 ; 14.74,-15.535 14.74,-13.331 15.74,-13.331 15.74,-15.535 14.74,-15.535 ; 17.28,-15.535 17.28,-13.331 18.28,-13.331 18.28,-15.535 17.28,-15.535 ; 19.82,-15.535 19.82,-13.331 20.82,-13.331 20.82,-15.535 19.82,-15.535 ; 22.36,-15.535 22.36,-13.331 23.36,-13.331 23.36,-15.535 22.36,-15.535 ; 24.9,-15.535 24.9,-13.331 25.9,-13.331 25.9,-15.535 24.9,-15.535 ; 27.44,-15.535 27.44,-13.331 28.44,-13.331 28.44,-15.535 27.44,-15.535
  text "1" at 27.559,-9.398 h1.27
3D body "TEXAS_ELC (R–MSIP–G23).stp": height 12.7, standoff -4, extent -32.605,-19.055 32.605,11.165

## TEXAS_EUT (R-PDSS-B5) [mm] "Texas EUT (R-PDSS-B5) Case"
height 8.5
pads (5):
  round 2.16 smd: 1(-7.94,4.765) 2(-7.94,-1.585) 3(-7.94,-4.765) 4(7.94,-4.765) 5(7.94,4.765)
Top Overlay:
  lines w0.2: -9.46,-6.285 -9.46,6.285 9.46,6.285 9.46,-6.285 -9.46,-6.285
Mechanical 8:
  lines w0.1: -8.94,-4.765 -7.94,-4.765 ; -8.94,-1.585 -7.94,-1.585 ; -8.94,4.765 -7.94,4.765 ; -7.94,-5.765 -7.94,-4.765 ; -7.94,-3.765 -7.94,-4.765 ; -7.94,-2.585 -7.94,-1.585 ; -7.94,-0.585 -7.94,-1.585 ; -7.94,3.765 -7.94,4.765 ; -7.94,5.765 -7.94,4.765 ; -6.94,-4.765 -7.94,-4.765 ; -6.94,-1.585 -7.94,-1.585 ; -6.94,4.765 -7.94,4.765 ; -1,0 0,0 ; 0,-1 0,0 ; 0,1 0,0 ; 1,0 0,0 ; 6.94,-4.765 7.94,-4.765 ; 6.94,4.765 7.94,4.765 ; 7.94,-5.765 7.94,-4.765 ; 7.94,-3.765 7.94,-4.765 ; 7.94,3.765 7.94,4.765 ; 7.94,5.765 7.94,4.765 ; 8.94,-4.765 7.94,-4.765 ; 8.94,4.765 7.94,4.765
Mechanical 14:
  lines w0.1: -9.46,-6.285 9.46,-6.285 9.46,6.285 -9.46,6.285 -9.46,-6.285 ; -8.247,-0.059 -5.547,-0.059 -5.547,3.341 -8.247,3.341 -8.247,-0.059 ; -3.912,-5.523 0.088,-5.523 0.088,-0.523 -3.912,-0.523 -3.912,-5.523 ; -3.912,0.502 0.088,0.502 0.088,5.502 -3.912,5.502 -3.912,0.502 ; 2.154,-3.194 8.154,-3.194 8.154,2.806 2.154,2.806 2.154,-3.194
Mechanical 15:
  lines w0.05: -9.97,-6.795 9.97,-6.795 9.97,6.795 -9.97,6.795 -9.97,-6.795
3D body "TEXAS_EUT (R-PDSS-B5).stp": height 8.5, standoff 0, extent -9.46,-6.285 9.46,6.285

## TEXAS_EUY (R-PDSS-B7) [mm] "TEXAS EUY (R-PDSS-B7)  Case"
height 9
pads (7):
  round 2.16 smd: 1(-11.115,6.35) 2(-11.115,-6.35) 3(-1.595,-6.35) 4(1.585,-6.35) 5(4.765,-6.35) 6(11.115,-6.35) 7(11.115,6.35)
Top Overlay:
  lines w0.2: -12.635,-7.875 -12.635,7.875 12.635,7.875 12.635,-7.875 -12.635,-7.875 ; -2.161,-3.965 7.839,-3.965 7.839,6.035 -2.161,6.035 -2.161,-3.965
Mechanical 8:
  lines w0.1: -12.115,-6.35 -11.115,-6.35 ; -12.115,6.35 -11.115,6.35 ; -11.115,-7.35 -11.115,-6.35 ; -11.115,-5.35 -11.115,-6.35 ; -11.115,5.35 -11.115,6.35 ; -11.115,7.35 -11.115,6.35 ; -10.115,-6.35 -11.115,-6.35 ; -10.115,6.35 -11.115,6.35 ; -2.595,-6.35 -1.595,-6.35 ; -1.595,-7.35 -1.595,-6.35 ; -1.595,-5.35 -1.595,-6.35 ; -1,0 0,0 ; -0.595,-6.35 -1.595,-6.35 ; 0,-1 0,0 ; 0,1 0,0 ; 0.585,-6.35 1.585,-6.35 ; 1,0 0,0 ; 1.585,-7.35 1.585,-6.35 ; 1.585,-5.35 1.585,-6.35 ; 2.585,-6.35 1.585,-6.35 ; 3.765,-6.35 4.765,-6.35 ; 4.765,-7.35 4.765,-6.35 ; 4.765,-5.35 4.765,-6.35 ; 5.765,-6.35 4.765,-6.35 ; 10.115,-6.35 11.115,-6.35 ; 10.115,6.35 11.115,6.35 ; 11.115,-7.35 11.115,-6.35 ; 11.115,-5.35 11.115,-6.35 ; 11.115,5.35 11.115,6.35 ; 11.115,7.35 11.115,6.35 ; 12.115,-6.35 11.115,-6.35 ; 12.115,6.35 11.115,6.35
Mechanical 14:
  circle w0.1: c11.115,6.35 r0.89
  circle w0.1: c11.115,-6.35 r0.89
  circle w0.1: c4.765,-6.35 r0.89
  circle w0.1: c1.585,-6.35 r0.89
  circle w0.1: c-1.595,-6.35 r0.89
  circle w0.1: c-11.115,-6.35 r0.89
  circle w0.1: c-11.115,6.35 r0.89
  lines w0.1: -12.635,-7.875 -12.635,7.875 12.635,7.875 12.635,-7.875 -12.635,-7.875 ; -2.161,-3.965 7.839,-3.965 7.839,6.035 -2.161,6.035 -2.161,-3.965
Mechanical 15:
  lines w0.05: -13.145,-8.38 -13.145,8.38 13.145,8.38 13.145,-8.38 -13.145,-8.38
3D body "TEXAS_EUY (R-PDSS-B7).stp": height 9.57, standoff 0, extent -12.635,-7.875 12.635,7.875

## TEXAS_PFM (NDY) [mm] "TEXAS PackagePFM (NDY), 1.27mm pitch; 15mm X 15mm X 6mm body"
height 6
pads (12):
  rect 2.41x0.86 smd: 1(-9.5,6.35) 2(-9.5,5.08) 3(-9.5,3.81) 4(-9.5,2.54) 5(-9.5,1.27) 6(-9.5,0) 7(-9.5,-1.27) 8(-9.5,-2.54) 9(-9.5,-3.81) 10(-9.5,-5.08) 11(-9.5,-6.35)
  rect 13.37x9.126 smd: 12(0,0)
Top Overlay:
  lines w0.2: -7.995,-6.68 -7.5,-6.68 ; -7.995,-6.02 -7.5,-6.02 ; -7.995,-5.41 -7.5,-5.41 ; -7.995,-4.75 -7.5,-4.75 ; -7.995,-4.14 -7.5,-4.14 ; -7.995,-3.48 -7.5,-3.48 ; -7.995,-2.87 -7.5,-2.87 ; -7.995,-2.21 -7.5,-2.21 ; -7.995,-1.6 -7.5,-1.6 ; -7.995,-0.94 -7.5,-0.94 ; -7.995,-0.33 -7.5,-0.33 ; -7.995,0.33 -7.5,0.33 ; -7.995,2.21 -7.5,2.21 ; -7.995,2.87 -7.5,2.87 ; -7.995,3.48 -7.5,3.48 ; -7.995,4.14 -7.5,4.14 ; -7.995,4.75 -7.5,4.75 ; -7.995,5.41 -7.5,5.41 ; -7.995,6.02 -7.5,6.02 ; -7.995,6.68 -7.5,6.68 ; -7.995,0.94 -7.5,0.94 -7.995,0.94 ; -7.995,1.6 -7.5,1.6 -7.995,1.6 ; -7.5,-7.5 7.5,-7.5 7.5,7.5 -7.5,7.5 -7.5,-7.5
Mechanical 8:
  lines w0.1: -10,-6.35 -9.5,-6.35 ; -10,-5.08 -9.5,-5.08 ; -10,-3.81 -9.5,-3.81 ; -10,-2.54 -9.5,-2.54 ; -10,-1.27 -9.5,-1.27 ; -10,0 -9.5,0 ; -10,1.27 -9.5,1.27 ; -10,2.54 -9.5,2.54 ; -10,3.81 -9.5,3.81 ; -10,5.08 -9.5,5.08 ; -10,6.35 -9.5,6.35 ; -9.5,-6.85 -9.5,-6.35 ; -9.5,-5.85 -9.5,-6.35 ; -9.5,-5.58 -9.5,-5.08 ; -9.5,-4.58 -9.5,-5.08 ; -9.5,-4.31 -9.5,-3.81 ; -9.5,-3.31 -9.5,-3.81 ; -9.5,-3.04 -9.5,-2.54 ; -9.5,-2.04 -9.5,-2.54 ; -9.5,-1.77 -9.5,-1.27 ; -9.5,-0.77 -9.5,-1.27 ; -9.5,-0.5 -9.5,0 ; -9.5,0.5 -9.5,0 ; -9.5,0.77 -9.5,1.27 ; -9.5,1.77 -9.5,1.27 ; -9.5,2.04 -9.5,2.54 ; -9.5,3.04 -9.5,2.54 ; -9.5,3.31 -9.5,3.81 ; -9.5,4.31 -9.5,3.81 ; -9.5,4.58 -9.5,5.08 ; -9.5,5.58 -9.5,5.08 ; -9.5,5.85 -9.5,6.35 ; -9.5,6.85 -9.5,6.35 ; -9,-6.35 -9.5,-6.35 ; -9,-5.08 -9.5,-5.08 ; -9,-3.81 -9.5,-3.81 ; -9,-2.54 -9.5,-2.54 ; -9,-1.27 -9.5,-1.27 ; -9,0 -9.5,0 ; -9,1.27 -9.5,1.27 ; -9,2.54 -9.5,2.54 ; -9,3.81 -9.5,3.81 ; -9,5.08 -9.5,5.08 ; -9,6.35 -9.5,6.35 ; -0.5,0 0,0 ; 0,-0.5 0,0 ; 0,0.5 0,0 ; 0.5,0 0,0 ; -10.705,-6.78 -10.705,-5.92 -8.295,-5.92 -8.295,-6.78 -10.705,-6.78 ; -10.705,-5.51 -10.705,-4.65 -8.295,-4.65 -8.295,-5.51 -10.705,-5.51 ; -10.705,-4.24 -10.705,-3.38 -8.295,-3.38 -8.295,-4.24 -10.705,-4.24 ; -10.705,-2.97 -10.705,-2.11 -8.295,-2.11 -8.295,-2.97 -10.705,-2.97 ; -10.705,-1.7 -10.705,-0.84 -8.295,-0.84 -8.295,-1.7 -10.705,-1.7 ; -10.705,-0.43 -10.705,0.43 -8.295,0.43 -8.295,-0.43 -10.705,-0.43 ; -10.705,0.84 -10.705,1.7 -8.295,1.7 -8.295,0.84 -10.705,0.84 ; -10.705,2.11 -10.705,2.97 -8.295,2.97 -8.295,2.11 -10.705,2.11 ; -10.705,3.38 -10.705,4.24 -8.295,4.24 -8.295,3.38 -10.705,3.38 ; -10.705,4.65 -10.705,5.51 -8.295,5.51 -8.295,4.65 -10.705,4.65 ; -10.705,5.92 -10.705,6.78 -8.295,6.78 -8.295,5.92 -10.705,5.92 ; -6.685,-4.563 6.685,-4.563 6.685,4.563 -6.685,4.563 -6.685,-4.563
Mechanical 14:
  lines w0.1: -7.5,-6.68 -10.28,-6.68 -10.28,-6.02 -7.5,-6.02 ; -7.5,-5.41 -10.28,-5.41 -10.28,-4.75 -7.5,-4.75 ; -7.5,-4.14 -10.28,-4.14 -10.28,-3.48 -7.5,-3.48 ; -7.5,-2.87 -10.28,-2.87 -10.28,-2.21 -7.5,-2.21 ; -7.5,-1.6 -10.28,-1.6 -10.28,-0.94 -7.5,-0.94 ; -7.5,-0.33 -10.28,-0.33 -10.28,0.33 -7.5,0.33 ; -7.5,0.94 -10.28,0.94 -10.28,1.6 -7.5,1.6 ; -7.5,2.21 -10.28,2.21 -10.28,2.87 -7.5,2.87 ; -7.5,3.48 -10.28,3.48 -10.28,4.14 -7.5,4.14 ; -7.5,4.75 -10.28,4.75 -10.28,5.41 -7.5,5.41 ; -7.5,6.02 -10.28,6.02 -10.28,6.68 -7.5,6.68 ; -7.5,-7.5 7.5,-7.5 7.5,7.5 -7.5,7.5 -7.5,-7.5
3D body "TEXAS_PFM (NDY).stp": height 6.11, standoff 0, extent -10.28,-7.5 7.5,7.5